# Altium footprint library SG__PCB_HOLE_Connector.PcbLib: 174 footprints (part 7 of 11)
Each footprint in its own frame and in the unit in brackets; x right, y up, seen from the top. Pads: shape width x height; smd on the part's side, far side on the other; paste and mask are expansions set on the pad; w line width, h text height; cw(c..) or ccw(c..) is an arc to the next point about the centre after c.
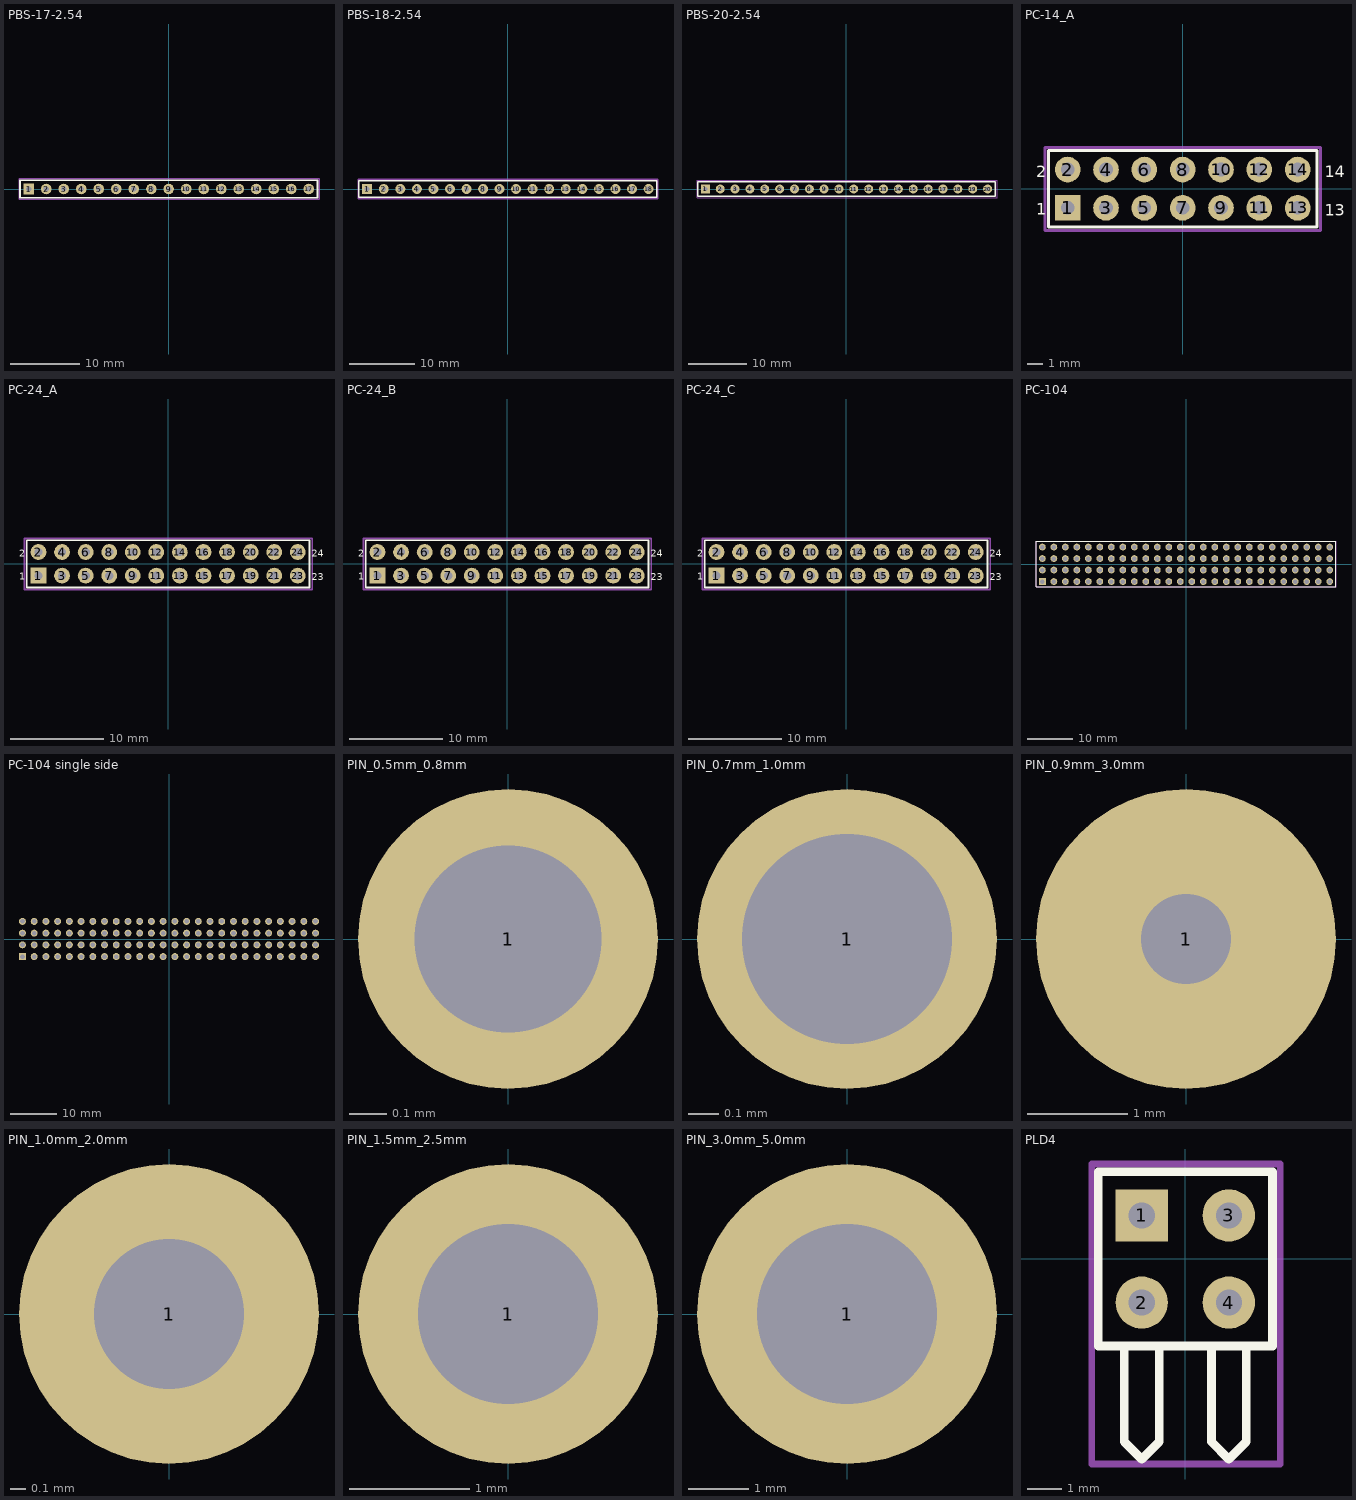
[diagram p6: the footprints below, top view; thin cyan lines are the x and y axes]

## PBS-17-2.54 [mil]
pads (17):
  rect 60x60 hole 30: 1(-799.41,0)
  round 60 hole 30: 2(-699.41,0) 3(-599.41,0) 4(-499.41,0) 5(-399.41,0) 6(-299.41,0) 7(-199.41,0) 8(-99.41,0) 9(-0.59,0) 10(99.41,0) 11(199.41,0) 12(299.41,0) 13(399.41,0) 14(499.41,0) 15(599.41,0) 16(699.41,0) 17(799.41,0)
Top Overlay:
  lines w10: -453.74,-50 849.41,-50 849.41,50 -453.74,50 ; -449.41,-50 -849.41,-50 -849.41,50 -449.41,50
Top Courtyard:
  lines w7.87: -854.92,-59.06 -854.92,59.06 857.68,59.06 857.68,-59.06 -854.92,-59.06
3D body "PBS1-2.54.stp": height 334.65, standoff -124.02, extent -849.41,-50 -749.41,50
3D body "PBS1-2.54.stp": height 334.65, standoff -124.02, extent -749.41,-50 -649.41,50
3D body "PBS1-2.54.stp": height 334.65, standoff -124.02, extent -649.41,-50 -549.41,50
3D body "PBS1-2.54.stp": height 334.65, standoff -124.02, extent -549.41,-50 -449.41,50
3D body "PBS1-2.54.stp": height 334.65, standoff -124.02, extent -449.41,-50 -349.41,50
3D body "PBS1-2.54.stp": height 334.65, standoff -124.02, extent -349.41,-50 -249.41,50
3D body "PBS1-2.54.stp": height 334.65, standoff -124.02, extent -249.41,-50 -149.41,50
3D body "PBS1-2.54.stp": height 334.65, standoff -124.02, extent -149.41,-50 -49.41,50
3D body "PBS1-2.54.stp": height 334.65, standoff -124.02, extent -50.59,-50 49.41,50
3D body "PBS1-2.54.stp": height 334.65, standoff -124.02, extent 49.41,-50 149.41,50
3D body "PBS1-2.54.stp": height 334.65, standoff -124.02, extent 149.41,-50 249.41,50
3D body "PBS1-2.54.stp": height 334.65, standoff -124.02, extent 249.41,-50 349.41,50
3D body "PBS1-2.54.stp": height 334.65, standoff -124.02, extent 349.41,-50 449.41,50
3D body "PBS1-2.54.stp": height 334.65, standoff -124.02, extent 449.41,-50 549.41,50
3D body "PBS1-2.54.stp": height 334.65, standoff -124.02, extent 549.41,-50 649.41,50
3D body "PBS1-2.54.stp": height 334.65, standoff -124.02, extent 649.41,-50 749.41,50
3D body "PBS1-2.54.stp": height 334.65, standoff -124.02, extent 749.41,-50 849.41,50

## PBS-18-2.54 [mil]
pads (18):
  rect 60x60 hole 30: 1(-849.41,0)
  round 60 hole 30: 2(-749.41,0) 3(-649.41,0) 4(-549.41,0) 5(-449.41,0) 6(-349.41,0) 7(-249.41,0) 8(-149.41,0) 9(-50.59,0) 10(49.41,0) 11(149.41,0) 12(249.41,0) 13(349.41,0) 14(449.41,0) 15(549.41,0) 16(649.41,0) 17(749.41,0) 18(849.41,0)
Top Overlay:
  lines w10: -503.74,-50 899.41,-50 899.41,50 -503.74,50 ; -499.41,-50 -899.41,-50 -899.41,50 -499.41,50
Top Courtyard:
  lines w7.87: -904.92,-59.06 -904.92,59.06 906.1,59.06 906.1,-59.06 -904.92,-59.06
3D body "PBS1-2.54.stp": height 334.65, standoff -124.02, extent 199.41,-50 299.41,50
3D body "PBS1-2.54.stp": height 334.65, standoff -124.02, extent 99.41,-50 199.41,50
3D body "PBS1-2.54.stp": height 334.65, standoff -124.02, extent -0.59,-50 99.41,50
3D body "PBS1-2.54.stp": height 334.65, standoff -124.02, extent -100.59,-50 -0.59,50
3D body "PBS1-2.54.stp": height 334.65, standoff -124.02, extent -199.41,-50 -99.41,50
3D body "PBS1-2.54.stp": height 334.65, standoff -124.02, extent -299.41,-50 -199.41,50
3D body "PBS1-2.54.stp": height 334.65, standoff -124.02, extent -399.41,-50 -299.41,50
3D body "PBS1-2.54.stp": height 334.65, standoff -124.02, extent -499.41,-50 -399.41,50
3D body "PBS1-2.54.stp": height 334.65, standoff -124.02, extent -599.41,-50 -499.41,50
3D body "PBS1-2.54.stp": height 334.65, standoff -124.02, extent -699.41,-50 -599.41,50
3D body "PBS1-2.54.stp": height 334.65, standoff -124.02, extent -799.41,-50 -699.41,50
3D body "PBS1-2.54.stp": height 334.65, standoff -124.02, extent -899.41,-50 -799.41,50
3D body "PBS1-2.54.stp": height 334.65, standoff -124.02, extent 799.41,-50 899.41,50
3D body "PBS1-2.54.stp": height 334.65, standoff -124.02, extent 699.41,-50 799.41,50
3D body "PBS1-2.54.stp": height 334.65, standoff -124.02, extent 599.41,-50 699.41,50
3D body "PBS1-2.54.stp": height 334.65, standoff -124.02, extent 499.41,-50 599.41,50
3D body "PBS1-2.54.stp": height 334.65, standoff -124.02, extent 399.41,-50 499.41,50
3D body "PBS1-2.54.stp": height 334.65, standoff -124.02, extent 299.41,-50 399.41,50

## PBS-20-2.54 [mil]
pads (20):
  rect 60x60 hole 30: 1(-949.41,0)
  round 60 hole 30: 2(-849.41,0) 3(-749.41,0) 4(-649.41,0) 5(-549.41,0) 6(-449.41,0) 7(-349.41,0) 8(-249.41,0) 9(-150.59,0) 10(-50.59,0) 11(49.41,0) 12(149.41,0) 13(249.41,0) 14(349.41,0) 15(449.41,0) 16(549.41,0) 17(649.41,0) 18(749.41,0) 19(849.41,0) 20(949.41,0)
Top Overlay:
  lines w10: -603.74,-50 999.42,-50 999.42,50 -603.74,50 ; -599.41,-50 -999.41,-50 -999.41,50 -599.41,50
Top Courtyard:
  lines w7.87: -1005.31,-59.06 -1005.31,59.06 1012.4,59.06 1012.4,-59.06 -1005.31,-59.06
3D body "PBS1-2.54.stp": height 334.65, standoff -124.02, extent 899.41,-50 999.41,50
3D body "PBS1-2.54.stp": height 334.65, standoff -124.02, extent -999.41,-50 -899.41,50
3D body "PBS1-2.54.stp": height 334.65, standoff -124.02, extent -899.41,-50 -799.41,50
3D body "PBS1-2.54.stp": height 334.65, standoff -124.02, extent -799.41,-50 -699.41,50
3D body "PBS1-2.54.stp": height 334.65, standoff -124.02, extent -699.41,-50 -599.41,50
3D body "PBS1-2.54.stp": height 334.65, standoff -124.02, extent -599.41,-50 -499.41,50
3D body "PBS1-2.54.stp": height 334.65, standoff -124.02, extent -499.41,-50 -399.41,50
3D body "PBS1-2.54.stp": height 334.65, standoff -124.02, extent -399.41,-50 -299.41,50
3D body "PBS1-2.54.stp": height 334.65, standoff -124.02, extent -299.41,-50 -199.41,50
3D body "PBS1-2.54.stp": height 334.65, standoff -124.02, extent -200.59,-50 -100.59,50
3D body "PBS1-2.54.stp": height 334.65, standoff -124.02, extent -100.59,-50 -0.59,50
3D body "PBS1-2.54.stp": height 334.65, standoff -124.02, extent -0.59,-50 99.41,50
3D body "PBS1-2.54.stp": height 334.65, standoff -124.02, extent 99.41,-50 199.41,50
3D body "PBS1-2.54.stp": height 334.65, standoff -124.02, extent 199.41,-50 299.41,50
3D body "PBS1-2.54.stp": height 334.65, standoff -124.02, extent 299.41,-50 399.41,50
3D body "PBS1-2.54.stp": height 334.65, standoff -124.02, extent 399.41,-50 499.41,50
3D body "PBS1-2.54.stp": height 334.65, standoff -124.02, extent 499.41,-50 599.41,50
3D body "PBS1-2.54.stp": height 334.65, standoff -124.02, extent 599.41,-50 699.41,50
3D body "PBS1-2.54.stp": height 334.65, standoff -124.02, extent 699.41,-50 799.41,50
3D body "PBS1-2.54.stp": height 334.65, standoff -124.02, extent 799.41,-50 899.41,50

## PC-14_A [mm]
pads (14):
  rect 1.7x1.7 hole 0.9: 1(-7.62,-1.27)
  round 1.7 hole 0.9: 2(-7.62,1.27) 3(-5.08,-1.27) 4(-5.08,1.27) 5(-2.54,-1.27) 6(-2.54,1.27) 7(0,-1.27) 8(0,1.27) 9(2.54,-1.27) 10(2.54,1.27) 11(5.08,-1.27) 12(5.08,1.27) 13(7.62,-1.27) 14(7.62,1.27)
Top Overlay:
  lines w0.2: -8.89,-2.54 -8.89,2.54 8.915,2.54 8.915,-2.54 -8.89,-2.54
  text "1" at -9.72,-1.73 h0.76
  text "2" at -9.72,0.77 h0.76
  text "13" at 9.398,-1.778 h0.76
  text "14" at 9.398,0.762 h0.76
Top Courtyard:
  lines w0.2: -9.12,-2.77 9.13,-2.77 9.13,2.73 -9.12,2.73 -9.12,-2.77
3D body "PC104-14.stp": height 11.68, standoff -12.32, extent -8.89,-2.66 8.89,2.609

## PC-24_A [mm]
pads (24):
  rect 1.7x1.7 hole 0.9: 1(-13.97,-1.27)
  round 1.7 hole 0.9: 2(-13.97,1.27) 3(-11.43,-1.27) 4(-11.43,1.27) 5(-8.89,-1.27) 6(-8.89,1.27) 7(-6.35,-1.27) 8(-6.35,1.27) 9(-3.81,-1.27) 10(-3.81,1.27) 11(-1.27,-1.27) 12(-1.27,1.27) 13(1.27,-1.27) 14(1.27,1.27) 15(3.81,-1.27) 16(3.81,1.27) 17(6.35,-1.27) 18(6.35,1.27) 19(8.89,-1.27) 20(8.89,1.27) 21(11.43,-1.27) 22(11.43,1.27) 23(13.97,-1.27) 24(13.97,1.27)
Top Overlay:
  lines w0.2: -15.24,-2.54 -15.24,2.54 15.24,2.54 15.24,-2.54 -15.24,-2.54
  text "1" at -16.07,-1.73 h0.76
  text "2" at -16.07,0.77 h0.76
  text "23" at 15.494,-1.778 h0.76
  text "24" at 15.494,0.762 h0.76
Top Courtyard:
  lines w0.2: -15.47,-2.77 15.53,-2.77 15.53,2.73 -15.47,2.73 -15.47,-2.77
3D body "разъем 12x2 pin 2mm.STEP": height 11, standoff -2, extent -15.37,-2.54 15.37,2.54

## PC-24_B [mm]
pads (24):
  rect 1.7x1.7 hole 0.9: 1(-13.97,-1.27)
  round 1.7 hole 0.9: 2(-13.97,1.27) 3(-11.43,-1.27) 4(-11.43,1.27) 5(-8.89,-1.27) 6(-8.89,1.27) 7(-6.35,-1.27) 8(-6.35,1.27) 9(-3.81,-1.27) 10(-3.81,1.27) 11(-1.27,-1.27) 12(-1.27,1.27) 13(1.27,-1.27) 14(1.27,1.27) 15(3.81,-1.27) 16(3.81,1.27) 17(6.35,-1.27) 18(6.35,1.27) 19(8.89,-1.27) 20(8.89,1.27) 21(11.43,-1.27) 22(11.43,1.27) 23(13.97,-1.27) 24(13.97,1.27)
Top Overlay:
  lines w0.2: -15.24,-2.54 -15.24,2.54 15.24,2.54 15.24,-2.54 -15.24,-2.54
  text "1" at -16.07,-1.73 h0.76
  text "2" at -16.07,0.77 h0.76
  text "23" at 15.494,-1.778 h0.76
  text "24" at 15.494,0.762 h0.76
Top Courtyard:
  lines w0.2: -15.47,-2.77 -15.47,2.73 15.53,2.73 15.53,-2.77 -15.47,-2.77
3D body "PC-24_B__ByAnRx.SLDPRT": height 11, standoff -7, extent -15.37,-2.54 15.37,2.54

## PC-24_C [mm]
pads (24):
  rect 1.7x1.7 hole 0.9: 1(-13.97,-1.27)
  round 1.7 hole 0.9: 2(-13.97,1.27) 3(-11.43,-1.27) 4(-11.43,1.27) 5(-8.89,-1.27) 6(-8.89,1.27) 7(-6.35,-1.27) 8(-6.35,1.27) 9(-3.81,-1.27) 10(-3.81,1.27) 11(-1.27,-1.27) 12(-1.27,1.27) 13(1.27,-1.27) 14(1.27,1.27) 15(3.81,-1.27) 16(3.81,1.27) 17(6.35,-1.27) 18(6.35,1.27) 19(8.89,-1.27) 20(8.89,1.27) 21(11.43,-1.27) 22(11.43,1.27) 23(13.97,-1.27) 24(13.97,1.27)
Top Overlay:
  lines w0.2: -15.24,-2.54 15.24,-2.54 15.24,2.54 -15.24,2.54 -15.24,-2.54
  text "24" at 15.494,0.762 h0.76
  text "23" at 15.494,-1.778 h0.76
  text "2" at -16.07,0.77 h0.76
  text "1" at -16.07,-1.73 h0.76
Top Courtyard:
  lines w0.2: -15.47,-2.77 15.53,-2.77 15.53,2.73 -15.47,2.73 -15.47,-2.77
3D body "разъем 12x2 pin.STEP": height 11, standoff -12, extent -15.37,-2.54 15.37,2.54

## PC-104 [mm] "PC104"
pads (104):
  rect 1.5x1.5 hole 1: 1(-31.75,-3.81)
  round 1.5 hole 1: 2(-31.75,-1.27) 3(-29.21,-3.81) 4(-29.21,-1.27) 5(-26.67,-3.81) 6(-26.67,-1.27) 7(-24.13,-3.81) 8(-24.13,-1.27) 9(-21.59,-3.81) 10(-21.59,-1.27) 11(-19.05,-3.81) 12(-19.05,-1.27) 13(-16.51,-3.81) 14(-16.51,-1.27) 15(-13.97,-3.81) 16(-13.97,-1.27) 17(-11.43,-3.81) 18(-11.43,-1.27) 19(-8.89,-3.81) 20(-8.89,-1.27) 21(-6.35,-3.81) 22(-6.35,-1.27) 23(-3.81,-3.81) 24(-3.81,-1.27) 25(-1.27,-3.81) 26(-1.27,-1.27) 27(1.27,-3.81) 28(1.27,-1.27) 29(3.81,-3.81) 30(3.81,-1.27) 31(6.35,-3.81) 32(6.35,-1.27) 33(8.89,-3.81) 34(8.89,-1.27) 35(11.43,-3.81) 36(11.43,-1.27) 37(13.97,-3.81) 38(13.97,-1.27) 39(16.51,-3.81) 40(16.51,-1.27) 41(19.05,-3.81) 42(19.05,-1.27) 43(21.59,-3.81) 44(21.59,-1.27) 45(24.13,-3.81) 46(24.13,-1.27) 47(26.67,-3.81) 48(26.67,-1.27) 49(29.21,-3.81) 50(29.21,-1.27) 51(31.75,-3.81) 52(31.75,-1.27) 53(-31.75,1.27) 54(-31.75,3.81) 55(-29.21,1.27) 56(-29.21,3.81) 57(-26.67,1.27) 58(-26.67,3.81) 59(-24.13,1.27) 60(-24.13,3.81) 61(-21.59,1.27) 62(-21.59,3.81) 63(-19.05,1.27) 64(-19.05,3.81) 65(-16.51,1.27) 66(-16.51,3.81) 67(-13.97,1.27) 68(-13.97,3.81) 69(-11.43,1.27) 70(-11.43,3.81) 71(-8.89,1.27) 72(-8.89,3.81) 73(-6.35,1.27) 74(-6.35,3.81) 75(-3.81,1.27) 76(-3.81,3.81) 77(-1.27,1.27) 78(-1.27,3.81) 79(1.27,1.27) 80(1.27,3.81) 81(3.81,1.27) 82(3.81,3.81) 83(6.35,1.27) 84(6.35,3.81) 85(8.89,1.27) 86(8.89,3.81) 87(11.43,1.27) 88(11.43,3.81) 89(13.97,1.27) 90(13.97,3.81) 91(16.51,1.27) 92(16.51,3.81) 93(19.05,1.27) 94(19.05,3.81) 95(21.59,1.27) 96(21.59,3.81) 97(24.13,1.27) 98(24.13,3.81) 99(26.67,1.27) 100(26.67,3.81) 101(29.21,1.27) 102(29.21,3.81) 103(31.75,1.27) 104(31.75,3.81)
Top Overlay:
  lines w0.254: -33.16,-4.97 33.13,-4.97 33.13,5.11 -33.16,5.11 -33.16,-4.97
Top Assembly:
  lines w0.254: -33.16,-4.97 -33.16,5.11 33.13,5.11 33.13,-4.97 -33.16,-4.97
Top Courtyard:
  lines w0.254: -33.158,-4.976 33.132,-4.976 33.132,5.104 -33.158,5.104 -33.158,-4.976
Bottom Courtyard:
  lines w0.254: -33.159,-4.976 33.131,-4.976 33.131,5.104 -33.159,5.104 -33.159,-4.976
3D body "PC104-52.stp": height 12.23, standoff -11.77, extent -33.16,-5.012 32.88,0.068
3D body "PC104-52.stp": height 12.23, standoff -11.77, extent -33.16,0.068 32.88,5.148

## PC-104 single side [mm] "PC104"
pads (104):
  rect 1.5x1.5 hole 1: 1(-31.75,-3.81)
  round 1.5 hole 1: 2(-31.75,-1.27) 3(-29.21,-3.81) 4(-29.21,-1.27) 5(-26.67,-3.81) 6(-26.67,-1.27) 7(-24.13,-3.81) 8(-24.13,-1.27) 9(-21.59,-3.81) 10(-21.59,-1.27) 11(-19.05,-3.81) 12(-19.05,-1.27) 13(-16.51,-3.81) 14(-16.51,-1.27) 15(-13.97,-3.81) 16(-13.97,-1.27) 17(-11.43,-3.81) 18(-11.43,-1.27) 19(-8.89,-3.81) 20(-8.89,-1.27) 21(-6.35,-3.81) 22(-6.35,-1.27) 23(-3.81,-3.81) 24(-3.81,-1.27) 25(-1.27,-3.81) 26(-1.27,-1.27) 27(1.27,-3.81) 28(1.27,-1.27) 29(3.81,-3.81) 30(3.81,-1.27) 31(6.35,-3.81) 32(6.35,-1.27) 33(8.89,-3.81) 34(8.89,-1.27) 35(11.43,-3.81) 36(11.43,-1.27) 37(13.97,-3.81) 38(13.97,-1.27) 39(16.51,-3.81) 40(16.51,-1.27) 41(19.05,-3.81) 42(19.05,-1.27) 43(21.59,-3.81) 44(21.59,-1.27) 45(24.13,-3.81) 46(24.13,-1.27) 47(26.67,-3.81) 48(26.67,-1.27) 49(29.21,-3.81) 50(29.21,-1.27) 51(31.75,-3.81) 52(31.75,-1.27) 53(-31.75,1.27) 54(-31.75,3.81) 55(-29.21,1.27) 56(-29.21,3.81) 57(-26.67,1.27) 58(-26.67,3.81) 59(-24.13,1.27) 60(-24.13,3.81) 61(-21.59,1.27) 62(-21.59,3.81) 63(-19.05,1.27) 64(-19.05,3.81) 65(-16.51,1.27) 66(-16.51,3.81) 67(-13.97,1.27) 68(-13.97,3.81) 69(-11.43,1.27) 70(-11.43,3.81) 71(-8.89,1.27) 72(-8.89,3.81) 73(-6.35,1.27) 74(-6.35,3.81) 75(-3.81,1.27) 76(-3.81,3.81) 77(-1.27,1.27) 78(-1.27,3.81) 79(1.27,1.27) 80(1.27,3.81) 81(3.81,1.27) 82(3.81,3.81) 83(6.35,1.27) 84(6.35,3.81) 85(8.89,1.27) 86(8.89,3.81) 87(11.43,1.27) 88(11.43,3.81) 89(13.97,1.27) 90(13.97,3.81) 91(16.51,1.27) 92(16.51,3.81) 93(19.05,1.27) 94(19.05,3.81) 95(21.59,1.27) 96(21.59,3.81) 97(24.13,1.27) 98(24.13,3.81) 99(26.67,1.27) 100(26.67,3.81) 101(29.21,1.27) 102(29.21,3.81) 103(31.75,1.27) 104(31.75,3.81)
3D body "female_header_a-bl254-dg-g26d.stp": height 8.5, standoff -3.2, extent -33.16,0.11 0.11,5.11
3D body "female_header_a-bl254-dg-g26d.stp": height 8.5, standoff -3.2, extent -33.16,-4.97 0.11,0.03
3D body "female_header_a-bl254-dg-g26d.stp": height 8.5, standoff -3.2, extent -0.14,-4.97 33.13,0.03
3D body "female_header_a-bl254-dg-g26d.stp": height 8.5, standoff -3.2, extent -0.14,0.11 33.13,5.11

## PIN_0.5mm_0.8mm [mm] "Hole diam, out size diam"
pads (1):
  round 0.8 hole 0.5 mask-0.05: 1(0,0)

## PIN_0.7mm_1.0mm [mm] "Hole diam, out size diam"
pads (1):
  round 1 hole 0.7: 1(0,0)

## PIN_0.9mm_3.0mm [mm] "Hole diam, out size diam"
pads (1):
  round 3 hole 0.9: 1(0,0)

## PIN_1.0mm_2.0mm [mm] "Hole diam, out size diam"
pads (1):
  round 2 hole 1: 1(0,0)

## PIN_1.5mm_2.5mm [mm]
height 12
pads (1):
  round 2.5 hole 1.5: 1(0,0)

## PIN_3.0mm_5.0mm [mm] "Hole diam, out size diam"
height 12
pads (1):
  round 5 hole 3: 1(0,0)

## PLD4 [mil]
pads (4):
  rect 60x60 hole 30: 1(-50,50)
  round 60 hole 30: 2(-50,-50) 3(50,50) 4(50,-50)
Top Overlay:
  lines w10: -70,-100 -70,-210 -50,-230 -30,-210 -30,-100 ; 30,-100 30,-210 50,-230 70,-210 70,-100 ; -100,-100 100,-100 100,100 -100,100 -100,-100
Top Courtyard:
  lines w7.87: -107.48,-235.43 -107.48,109.06 109.06,109.06 109.06,-235.43 -107.48,-235.43
3D body "pld.stp": height 298.43, standoff 0, extent 0,-230 100,101.5
3D body "pld.stp": height 298.43, standoff 0, extent -100,-230 0,101.5